# Altium schematic symbol library jlcpcb_2025_04_inductors_extended_0603.schlib: 1269 symbols (part 6 of 7)
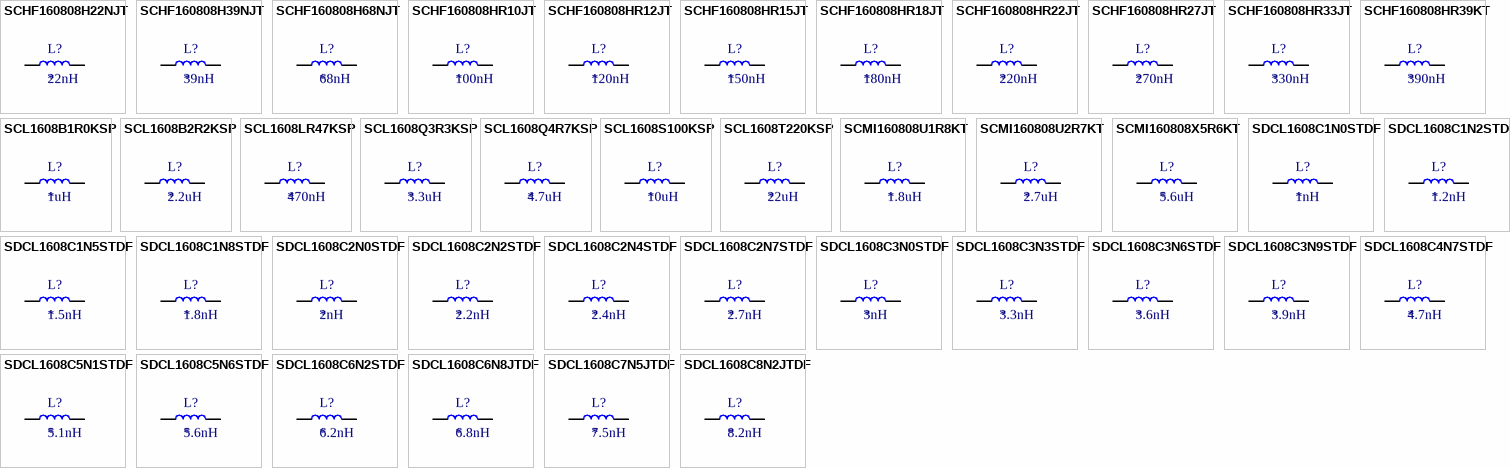
[diagram p36: symbols SCHF160808H22NJT to SDCL1608C8N2JTDF]

## SCL1608LR47KSP
designator L?  Inductance: 470nH
Inductor, 470nH, ±10%, 1.35Ω, 35mA, SMD 0603; Manufacturer: Sunltech Tech; Manufacturer Part Number: SCL1608LR47KSP; Package Size: 0603; JLCPCB Basic Part: No; JLCPCB Part Number: C411944; Supplier 1: LCSC; Category: Inductors; Supplier Part Number 1: C411944; Tolerance: ±10%; Rated Current: 35mA; DC Resistance: 1.35Ω; RoHS: Yes; ComponentLink1Description: Datasheet; ComponentLink1URL: https://wmsc.lcsc.com/wmsc/upload/file/pdf/v2/lcsc/2304140030_Sunltech-Tech-SCL1608LR47KSP_C411944.pdf; ComponentLink2Description: JLCPCB Part URL; ComponentLink2URL: https://jlcpcb.com/partdetail/C411944; ComponentLink3Description: LCSC Part URL; ComponentLink3URL: https://lcsc.com/product-detail/Inductors-SMD_Sunltech-Tech-Sunltech-Tech-SCL1608LR47KSP_C411944.html
footprint IND-0603 (0603 (1608M) Inductor)
pins: 1, 2

## SCL1608Q3R3KSP
designator L?  Inductance: 3.3uH
Inductor, 3.3uH, ±10%, 1.55Ω, 15mA, SMD 0603; Manufacturer: Sunltech Tech; Manufacturer Part Number: SCL1608Q3R3KSP; Package Size: 0603; JLCPCB Basic Part: No; JLCPCB Part Number: C411948; Supplier 1: LCSC; Category: Inductors; Supplier Part Number 1: C411948; Tolerance: ±10%; Rated Current: 15mA; DC Resistance: 1.55Ω; RoHS: Yes; ComponentLink1Description: Datasheet; ComponentLink1URL: https://wmsc.lcsc.com/wmsc/upload/file/pdf/v2/lcsc/2304140030_Sunltech-Tech-SCL1608Q3R3KSP_C411948.pdf; ComponentLink2Description: JLCPCB Part URL; ComponentLink2URL: https://jlcpcb.com/partdetail/C411948; ComponentLink3Description: LCSC Part URL; ComponentLink3URL: https://lcsc.com/product-detail/Inductors-SMD_Sunltech-Tech-Sunltech-Tech-SCL1608Q3R3KSP_C411948.html
footprint IND-0603 (0603 (1608M) Inductor)
pins: 1, 2

## SCL1608Q4R7KSP
designator L?  Inductance: 4.7uH
Inductor, 4.7uH, ±10%, 2.1Ω, 15mA, SMD 0603; Manufacturer: Sunltech Tech; Manufacturer Part Number: SCL1608Q4R7KSP; Package Size: 0603; JLCPCB Basic Part: No; JLCPCB Part Number: C411949; Supplier 1: LCSC; Category: Inductors; Supplier Part Number 1: C411949; Tolerance: ±10%; Rated Current: 15mA; DC Resistance: 2.1Ω; RoHS: Yes; ComponentLink1Description: Datasheet; ComponentLink1URL: https://wmsc.lcsc.com/wmsc/upload/file/pdf/v2/lcsc/2304140030_Sunltech-Tech-SCL1608Q4R7KSP_C411949.pdf; ComponentLink2Description: JLCPCB Part URL; ComponentLink2URL: https://jlcpcb.com/partdetail/C411949; ComponentLink3Description: LCSC Part URL; ComponentLink3URL: https://lcsc.com/product-detail/Inductors-SMD_Sunltech-Tech-Sunltech-Tech-SCL1608Q4R7KSP_C411949.html
footprint IND-0603 (0603 (1608M) Inductor)
pins: 1, 2

## SCL1608S100KSP
designator L?  Inductance: 10uH
Inductor, 10uH, ±10%, 1.85Ω, 3mA, SMD 0603; Manufacturer: Sunltech Tech; Manufacturer Part Number: SCL1608S100KSP; Package Size: 0603; JLCPCB Basic Part: No; JLCPCB Part Number: C411950; Supplier 1: LCSC; Category: Inductors; Supplier Part Number 1: C411950; Tolerance: ±10%; Rated Current: 3mA; DC Resistance: 1.85Ω; RoHS: Yes; ComponentLink1Description: Datasheet; ComponentLink1URL: https://wmsc.lcsc.com/wmsc/upload/file/pdf/v2/lcsc/2304140030_Sunltech-Tech-SCL1608S100KSP_C411950.pdf; ComponentLink2Description: JLCPCB Part URL; ComponentLink2URL: https://jlcpcb.com/partdetail/C411950; ComponentLink3Description: LCSC Part URL; ComponentLink3URL: https://lcsc.com/product-detail/Inductors-SMD_Sunltech-Tech-Sunltech-Tech-SCL1608S100KSP_C411950.html
footprint IND-0603 (0603 (1608M) Inductor)
pins: 1, 2

## SCL1608T220KSP
designator L?  Inductance: 22uH
Inductor, 22uH, ±10%, 2.1Ω, 1mA, SMD 0603; Manufacturer: Sunltech Tech; Manufacturer Part Number: SCL1608T220KSP; Package Size: 0603; JLCPCB Basic Part: No; JLCPCB Part Number: C411951; Supplier 1: LCSC; Category: Inductors; Supplier Part Number 1: C411951; Tolerance: ±10%; Rated Current: 1mA; DC Resistance: 2.1Ω; RoHS: Yes; ComponentLink1Description: Datasheet; ComponentLink1URL: https://wmsc.lcsc.com/wmsc/upload/file/pdf/v2/lcsc/2304140030_Sunltech-Tech-SCL1608T220KSP_C411951.pdf; ComponentLink2Description: JLCPCB Part URL; ComponentLink2URL: https://jlcpcb.com/partdetail/C411951; ComponentLink3Description: LCSC Part URL; ComponentLink3URL: https://lcsc.com/product-detail/Inductors-SMD_Sunltech-Tech-Sunltech-Tech-SCL1608T220KSP_C411951.html
footprint IND-0603 (0603 (1608M) Inductor)
pins: 1, 2

## SCMI160808U1R8KT
designator L?  Inductance: 1.8uH
Inductor, 1.8uH, ±10%, 750mΩ, 25mA, SMD 0603; Manufacturer: Yanchuang; Manufacturer Part Number: SCMI160808U1R8KT; Package Size: 0603; JLCPCB Basic Part: No; JLCPCB Part Number: C479883; Supplier 1: LCSC; Category: Inductors; Supplier Part Number 1: C479883; Tolerance: ±10%; Rated Current: 25mA; DC Resistance: 750mΩ; RoHS: Yes; ComponentLink1Description: Datasheet; ComponentLink1URL: https://wmsc.lcsc.com/wmsc/upload/file/pdf/v2/lcsc/2007222002_Yanchuang-SCMI160808U1R8KT_C479883.pdf; ComponentLink2Description: JLCPCB Part URL; ComponentLink2URL: https://jlcpcb.com/partdetail/C479883; ComponentLink3Description: LCSC Part URL; ComponentLink3URL: https://lcsc.com/product-detail/Inductors-SMD_Yanchuang-Yanchuang-SCMI160808U1R8KT_C479883.html
footprint IND-0603 (0603 (1608M) Inductor)
pins: 1, 2

## SCMI160808U2R7KT
designator L?  Inductance: 2.7uH
Inductor, 2.7uH, ±10%, 900mΩ, 15mA, SMD 0603; Manufacturer: Yanchuang; Manufacturer Part Number: SCMI160808U2R7KT; Package Size: 0603; JLCPCB Basic Part: No; JLCPCB Part Number: C479885; Supplier 1: LCSC; Category: Inductors; Supplier Part Number 1: C479885; Tolerance: ±10%; Rated Current: 15mA; DC Resistance: 900mΩ; RoHS: Yes; ComponentLink1Description: Datasheet; ComponentLink1URL: https://wmsc.lcsc.com/wmsc/upload/file/pdf/v2/lcsc/2007222002_Yanchuang-SCMI160808U2R7KT_C479885.pdf; ComponentLink2Description: JLCPCB Part URL; ComponentLink2URL: https://jlcpcb.com/partdetail/C479885; ComponentLink3Description: LCSC Part URL; ComponentLink3URL: https://lcsc.com/product-detail/Inductors-SMD_Yanchuang-Yanchuang-SCMI160808U2R7KT_C479885.html
footprint IND-0603 (0603 (1608M) Inductor)
pins: 1, 2

## SCMI160808X5R6KT
designator L?  Inductance: 5.6uH
Inductor, 5.6uH, ±10%, 1.55Ω, 5mA, SMD 0603; Manufacturer: Yanchuang; Manufacturer Part Number: SCMI160808X5R6KT; Self-Resonant Frequency: 22MHz; Q Factor: 12@4MHz; Package Size: 0603; JLCPCB Basic Part: No; JLCPCB Part Number: C479889; Supplier 1: LCSC; Category: Inductors; Supplier Part Number 1: C479889; Tolerance: ±10%; Rated Current: 5mA; DC Resistance: 1.55Ω; RoHS: Yes; ComponentLink1Description: Datasheet; ComponentLink1URL: https://wmsc.lcsc.com/wmsc/upload/file/pdf/v2/lcsc/2012021807_Yanchuang-SCMI160808X5R6KT_C479889.pdf; ComponentLink2Description: JLCPCB Part URL; ComponentLink2URL: https://jlcpcb.com/partdetail/C479889; ComponentLink3Description: LCSC Part URL; ComponentLink3URL: https://lcsc.com/product-detail/Inductors-SMD_Yanchuang-Yanchuang-SCMI160808X5R6KT_C479889.html
footprint IND-0603 (0603 (1608M) Inductor)
pins: 1, 2

## SDCL1608C1N0STDF
designator L?  Inductance: 1nH
Inductor, 1nH, 50mΩ, 500mA, SMD 0603; Manufacturer: Sunlord; Manufacturer Part Number: SDCL1608C1N0STDF; Self-Resonant Frequency: 100MHz; Q Factor: 8@100MHz; Package Size: 0603; JLCPCB Basic Part: No; JLCPCB Part Number: C41902; Supplier 1: LCSC; Category: Inductors; Supplier Part Number 1: C41902; Rated Current: 500mA; DC Resistance: 50mΩ; RoHS: Yes; ComponentLink1Description: Datasheet; ComponentLink1URL: https://wmsc.lcsc.com/wmsc/upload/file/pdf/v2/lcsc/2310301641_Sunlord-SDCL1608C1N0STDF_C41902.pdf; ComponentLink2Description: JLCPCB Part URL; ComponentLink2URL: https://jlcpcb.com/partdetail/C41902; ComponentLink3Description: LCSC Part URL; ComponentLink3URL: https://lcsc.com/product-detail/Inductors-SMD_Sunlord-Sunlord-SDCL1608C1N0STDF_C41902.html
footprint IND-0603 (0603 (1608M) Inductor)
pins: 1, 2

## SDCL1608C1N2STDF
designator L?  Inductance: 1.2nH
Inductor, 1.2nH, 50mΩ, 500mA, SMD 0603; Manufacturer: Sunlord; Manufacturer Part Number: SDCL1608C1N2STDF; Self-Resonant Frequency: 100MHz; Q Factor: 8@100MHz; Package Size: 0603; JLCPCB Basic Part: No; JLCPCB Part Number: C74311; Supplier 1: LCSC; Category: Inductors; Supplier Part Number 1: C74311; Rated Current: 500mA; DC Resistance: 50mΩ; RoHS: Yes; ComponentLink1Description: Datasheet; ComponentLink1URL: https://wmsc.lcsc.com/wmsc/upload/file/pdf/v2/lcsc/2310301641_Sunlord-SDCL1608C1N2STDF_C74311.pdf; ComponentLink2Description: JLCPCB Part URL; ComponentLink2URL: https://jlcpcb.com/partdetail/C74311; ComponentLink3Description: LCSC Part URL; ComponentLink3URL: https://lcsc.com/product-detail/Inductors-SMD_Sunlord-Sunlord-SDCL1608C1N2STDF_C74311.html
footprint IND-0603 (0603 (1608M) Inductor)
pins: 1, 2

## SDCL1608C1N5STDF
designator L?  Inductance: 1.5nH
Inductor, 1.5nH, 100mΩ, 500mA, SMD 0603; Manufacturer: Sunlord; Manufacturer Part Number: SDCL1608C1N5STDF; Self-Resonant Frequency: 100MHz; Q Factor: 8@100MHz; Package Size: 0603; JLCPCB Basic Part: No; JLCPCB Part Number: C22223; Supplier 1: LCSC; Category: Inductors; Supplier Part Number 1: C22223; Rated Current: 500mA; DC Resistance: 100mΩ; RoHS: Yes; ComponentLink1Description: Datasheet; ComponentLink1URL: https://wmsc.lcsc.com/wmsc/upload/file/pdf/v2/lcsc/2310301641_Sunlord-SDCL1608C1N5STDF_C22223.pdf; ComponentLink2Description: JLCPCB Part URL; ComponentLink2URL: https://jlcpcb.com/partdetail/C22223; ComponentLink3Description: LCSC Part URL; ComponentLink3URL: https://lcsc.com/product-detail/Inductors-SMD_Sunlord-Sunlord-SDCL1608C1N5STDF_C22223.html
footprint IND-0603 (0603 (1608M) Inductor)
pins: 1, 2

## SDCL1608C1N8STDF
designator L?  Inductance: 1.8nH
Inductor, 1.8nH, 100mΩ, 500mA, SMD 0603; Manufacturer: Sunlord; Manufacturer Part Number: SDCL1608C1N8STDF; Self-Resonant Frequency: 6GHz; Q Factor: 8@100MHz; Package Size: 0603; JLCPCB Basic Part: No; JLCPCB Part Number: C44946; Supplier 1: LCSC; Category: Inductors; Supplier Part Number 1: C44946; Rated Current: 500mA; DC Resistance: 100mΩ; RoHS: Yes; ComponentLink1Description: Datasheet; ComponentLink1URL: https://wmsc.lcsc.com/wmsc/upload/file/pdf/v2/lcsc/2310301641_Sunlord-SDCL1608C1N8STDF_C44946.pdf; ComponentLink2Description: JLCPCB Part URL; ComponentLink2URL: https://jlcpcb.com/partdetail/C44946; ComponentLink3Description: LCSC Part URL; ComponentLink3URL: https://lcsc.com/product-detail/Inductors-SMD_Sunlord-Sunlord-SDCL1608C1N8STDF_C44946.html
footprint IND-0603 (0603 (1608M) Inductor)
pins: 1, 2

## SDCL1608C2N0STDF
designator L?  Inductance: 2nH
Inductor, 2nH, SMD 0603; Manufacturer: Sunlord; Manufacturer Part Number: SDCL1608C2N0STDF; Package Size: 0603; JLCPCB Basic Part: No; JLCPCB Part Number: C370234; Supplier 1: LCSC; Category: Inductors; Supplier Part Number 1: C370234; RoHS: Yes; ComponentLink1Description: Datasheet; ComponentLink1URL: https://wmsc.lcsc.com/wmsc/upload/file/pdf/v2/lcsc/2310301641_Sunlord-SDCL1608C2N0STDF_C370234.pdf; ComponentLink2Description: JLCPCB Part URL; ComponentLink2URL: https://jlcpcb.com/partdetail/C370234; ComponentLink3Description: LCSC Part URL; ComponentLink3URL: https://lcsc.com/product-detail/Inductors-SMD_Sunlord-Sunlord-SDCL1608C2N0STDF_C370234.html
footprint IND-0603 (0603 (1608M) Inductor)
pins: 1, 2

## SDCL1608C2N2STDF
designator L?  Inductance: 2.2nH
Inductor, 2.2nH, 100mΩ, 500mA, SMD 0603; Manufacturer: Sunlord; Manufacturer Part Number: SDCL1608C2N2STDF; Self-Resonant Frequency: 100MHz; Q Factor: 8@100MHz; Package Size: 0603; JLCPCB Basic Part: No; JLCPCB Part Number: C29682; Supplier 1: LCSC; Category: Inductors; Supplier Part Number 1: C29682; Rated Current: 500mA; DC Resistance: 100mΩ; RoHS: Yes; ComponentLink1Description: Datasheet; ComponentLink1URL: https://wmsc.lcsc.com/wmsc/upload/file/pdf/v2/lcsc/2310301641_Sunlord-SDCL1608C2N2STDF_C29682.pdf; ComponentLink2Description: JLCPCB Part URL; ComponentLink2URL: https://jlcpcb.com/partdetail/C29682; ComponentLink3Description: LCSC Part URL; ComponentLink3URL: https://lcsc.com/product-detail/Inductors-SMD_Sunlord-Sunlord-SDCL1608C2N2STDF_C29682.html
footprint IND-0603 (0603 (1608M) Inductor)
pins: 1, 2

## SDCL1608C2N4STDF
designator L?  Inductance: 2.4nH
Inductor, 2.4nH, SMD 0603; Manufacturer: Sunlord; Manufacturer Part Number: SDCL1608C2N4STDF; Package Size: 0603; JLCPCB Basic Part: No; JLCPCB Part Number: C370235; Supplier 1: LCSC; Category: Inductors; Supplier Part Number 1: C370235; RoHS: Yes; ComponentLink1Description: Datasheet; ComponentLink1URL: https://wmsc.lcsc.com/wmsc/upload/file/pdf/v2/lcsc/2310301641_Sunlord-SDCL1608C2N4STDF_C370235.pdf; ComponentLink2Description: JLCPCB Part URL; ComponentLink2URL: https://jlcpcb.com/partdetail/C370235; ComponentLink3Description: LCSC Part URL; ComponentLink3URL: https://lcsc.com/product-detail/Inductors-SMD_Sunlord-Sunlord-SDCL1608C2N4STDF_C370235.html
footprint IND-0603 (0603 (1608M) Inductor)
pins: 1, 2

## SDCL1608C2N7STDF
designator L?  Inductance: 2.7nH
Inductor, 2.7nH, 120mΩ, 500mA, SMD 0603; Manufacturer: Sunlord; Manufacturer Part Number: SDCL1608C2N7STDF; Q Factor: 10@100MHz; Package Size: 0603; JLCPCB Basic Part: No; JLCPCB Part Number: C13817; Supplier 1: LCSC; Category: Inductors; Supplier Part Number 1: C13817; Rated Current: 500mA; DC Resistance: 120mΩ; RoHS: Yes; ComponentLink1Description: Datasheet; ComponentLink1URL: https://wmsc.lcsc.com/wmsc/upload/file/pdf/v2/lcsc/2310301641_Sunlord-SDCL1608C2N7STDF_C13817.pdf; ComponentLink2Description: JLCPCB Part URL; ComponentLink2URL: https://jlcpcb.com/partdetail/C13817; ComponentLink3Description: LCSC Part URL; ComponentLink3URL: https://lcsc.com/product-detail/Inductors-SMD_Sunlord-Sunlord-SDCL1608C2N7STDF_C13817.html
footprint IND-0603 (0603 (1608M) Inductor)
pins: 1, 2

## SDCL1608C3N0STDF
designator L?  Inductance: 3nH
Inductor, 3nH, 150mΩ, 500mA, SMD 0603; Manufacturer: Sunlord; Manufacturer Part Number: SDCL1608C3N0STDF; Package Size: 0603; JLCPCB Basic Part: No; JLCPCB Part Number: C22724; Supplier 1: LCSC; Category: Inductors; Supplier Part Number 1: C22724; Rated Current: 500mA; DC Resistance: 150mΩ; RoHS: Yes; ComponentLink1Description: Datasheet; ComponentLink1URL: https://wmsc.lcsc.com/wmsc/upload/file/pdf/v2/lcsc/2310301641_Sunlord-SDCL1608C3N0STDF_C22724.pdf; ComponentLink2Description: JLCPCB Part URL; ComponentLink2URL: https://jlcpcb.com/partdetail/C22724; ComponentLink3Description: LCSC Part URL; ComponentLink3URL: https://lcsc.com/product-detail/Inductors-SMD_Sunlord-Sunlord-SDCL1608C3N0STDF_C22724.html
footprint IND-0603 (0603 (1608M) Inductor)
pins: 1, 2

## SDCL1608C3N3STDF
designator L?  Inductance: 3.3nH
Inductor, 3.3nH, 150mΩ, 500mA, SMD 0603; Manufacturer: Sunlord; Manufacturer Part Number: SDCL1608C3N3STDF; Self-Resonant Frequency: 100MHz; Q Factor: 10@100MHz; Package Size: 0603; JLCPCB Basic Part: No; JLCPCB Part Number: C27274; Supplier 1: LCSC; Category: Inductors; Supplier Part Number 1: C27274; Rated Current: 500mA; DC Resistance: 150mΩ; RoHS: Yes; ComponentLink1Description: Datasheet; ComponentLink1URL: https://wmsc.lcsc.com/wmsc/upload/file/pdf/v2/lcsc/2310301641_Sunlord-SDCL1608C3N3STDF_C27274.pdf; ComponentLink2Description: JLCPCB Part URL; ComponentLink2URL: https://jlcpcb.com/partdetail/C27274; ComponentLink3Description: LCSC Part URL; ComponentLink3URL: https://lcsc.com/product-detail/Inductors-SMD_Sunlord-Sunlord-SDCL1608C3N3STDF_C27274.html
footprint IND-0603 (0603 (1608M) Inductor)
pins: 1, 2

## SDCL1608C3N6STDF
designator L?  Inductance: 3.6nH
Inductor, 3.6nH, SMD 0603; Manufacturer: Sunlord; Manufacturer Part Number: SDCL1608C3N6STDF; Package Size: 0603; JLCPCB Basic Part: No; JLCPCB Part Number: C370237; Supplier 1: LCSC; Category: Inductors; Supplier Part Number 1: C370237; RoHS: Yes; ComponentLink1Description: Datasheet; ComponentLink1URL: https://wmsc.lcsc.com/wmsc/upload/file/pdf/v2/lcsc/2310301641_Sunlord-SDCL1608C3N6STDF_C370237.pdf; ComponentLink2Description: JLCPCB Part URL; ComponentLink2URL: https://jlcpcb.com/partdetail/C370237; ComponentLink3Description: LCSC Part URL; ComponentLink3URL: https://lcsc.com/product-detail/Inductors-SMD_Sunlord-Sunlord-SDCL1608C3N6STDF_C370237.html
footprint IND-0603 (0603 (1608M) Inductor)
pins: 1, 2

## SDCL1608C3N9STDF
designator L?  Inductance: 3.9nH
Inductor, 3.9nH, 160mΩ, 500mA, SMD 0603; Manufacturer: Sunlord; Manufacturer Part Number: SDCL1608C3N9STDF; Self-Resonant Frequency: 100MHz; Q Factor: 10@100MHz; Package Size: 0603; JLCPCB Basic Part: No; JLCPCB Part Number: C13818; Supplier 1: LCSC; Category: Inductors; Supplier Part Number 1: C13818; Rated Current: 500mA; DC Resistance: 160mΩ; RoHS: Yes; ComponentLink1Description: Datasheet; ComponentLink1URL: https://wmsc.lcsc.com/wmsc/upload/file/pdf/v2/lcsc/2310301641_Sunlord-SDCL1608C3N9STDF_C13818.pdf; ComponentLink2Description: JLCPCB Part URL; ComponentLink2URL: https://jlcpcb.com/partdetail/C13818; ComponentLink3Description: LCSC Part URL; ComponentLink3URL: https://lcsc.com/product-detail/Inductors-SMD_Sunlord-Sunlord-SDCL1608C3N9STDF_C13818.html
footprint IND-0603 (0603 (1608M) Inductor)
pins: 1, 2

## SDCL1608C4N7STDF
designator L?  Inductance: 4.7nH
Inductor, 4.7nH, 200mΩ, 500mA, SMD 0603; Manufacturer: Sunlord; Manufacturer Part Number: SDCL1608C4N7STDF; Self-Resonant Frequency: 100MHz; Q Factor: 10@100MHz; Package Size: 0603; JLCPCB Basic Part: No; JLCPCB Part Number: C89955; Supplier 1: LCSC; Category: Inductors; Supplier Part Number 1: C89955; Rated Current: 500mA; DC Resistance: 200mΩ; RoHS: Yes; ComponentLink1Description: Datasheet; ComponentLink1URL: https://wmsc.lcsc.com/wmsc/upload/file/pdf/v2/lcsc/2310301641_Sunlord-SDCL1608C4N7STDF_C89955.pdf; ComponentLink2Description: JLCPCB Part URL; ComponentLink2URL: https://jlcpcb.com/partdetail/C89955; ComponentLink3Description: LCSC Part URL; ComponentLink3URL: https://lcsc.com/product-detail/Inductors-SMD_Sunlord-Sunlord-SDCL1608C4N7STDF_C89955.html
footprint IND-0603 (0603 (1608M) Inductor)
pins: 1, 2

## SDCL1608C5N1STDF
designator L?  Inductance: 5.1nH
Inductor, 5.1nH, SMD 0603; Manufacturer: Sunlord; Manufacturer Part Number: SDCL1608C5N1STDF; Package Size: 0603; JLCPCB Basic Part: No; JLCPCB Part Number: C370239; Supplier 1: LCSC; Category: Inductors; Supplier Part Number 1: C370239; RoHS: Yes; ComponentLink1Description: Datasheet; ComponentLink1URL: https://wmsc.lcsc.com/wmsc/upload/file/pdf/v2/lcsc/2310301641_Sunlord-SDCL1608C5N1STDF_C370239.pdf; ComponentLink2Description: JLCPCB Part URL; ComponentLink2URL: https://jlcpcb.com/partdetail/C370239; ComponentLink3Description: LCSC Part URL; ComponentLink3URL: https://lcsc.com/product-detail/Inductors-SMD_Sunlord-Sunlord-SDCL1608C5N1STDF_C370239.html
footprint IND-0603 (0603 (1608M) Inductor)
pins: 1, 2

## SDCL1608C5N6STDF
designator L?  Inductance: 5.6nH
Inductor, 5.6nH, 250mΩ, 500mA, SMD 0603; Manufacturer: Sunlord; Manufacturer Part Number: SDCL1608C5N6STDF; Self-Resonant Frequency: 100MHz; Q Factor: 10@100MHz; Package Size: 0603; JLCPCB Basic Part: No; JLCPCB Part Number: C74312; Supplier 1: LCSC; Category: Inductors; Supplier Part Number 1: C74312; Rated Current: 500mA; DC Resistance: 250mΩ; RoHS: Yes; ComponentLink1Description: Datasheet; ComponentLink1URL: https://wmsc.lcsc.com/wmsc/upload/file/pdf/v2/lcsc/2310301641_Sunlord-SDCL1608C5N6STDF_C74312.pdf; ComponentLink2Description: JLCPCB Part URL; ComponentLink2URL: https://jlcpcb.com/partdetail/C74312; ComponentLink3Description: LCSC Part URL; ComponentLink3URL: https://lcsc.com/product-detail/Inductors-SMD_Sunlord-Sunlord-SDCL1608C5N6STDF_C74312.html
footprint IND-0603 (0603 (1608M) Inductor)
pins: 1, 2

## SDCL1608C6N2STDF
designator L?  Inductance: 6.2nH
Inductor, 6.2nH, SMD 0603; Manufacturer: Sunlord; Manufacturer Part Number: SDCL1608C6N2STDF; Package Size: 0603; JLCPCB Basic Part: No; JLCPCB Part Number: C370240; Supplier 1: LCSC; Category: Inductors; Supplier Part Number 1: C370240; RoHS: Yes; ComponentLink1Description: Datasheet; ComponentLink1URL: https://wmsc.lcsc.com/wmsc/upload/file/pdf/v2/lcsc/2310301641_Sunlord-SDCL1608C6N2STDF_C370240.pdf; ComponentLink2Description: JLCPCB Part URL; ComponentLink2URL: https://jlcpcb.com/partdetail/C370240; ComponentLink3Description: LCSC Part URL; ComponentLink3URL: https://lcsc.com/product-detail/Inductors-SMD_Sunlord-Sunlord-SDCL1608C6N2STDF_C370240.html
footprint IND-0603 (0603 (1608M) Inductor)
pins: 1, 2

## SDCL1608C6N8JTDF
designator L?  Inductance: 6.8nH
Inductor, 6.8nH, ±5%, 300mΩ, 500mA, SMD 0603; Manufacturer: Sunlord; Manufacturer Part Number: SDCL1608C6N8JTDF; Self-Resonant Frequency: 100MHz; Q Factor: 10@100MHz; Package Size: 0603; JLCPCB Basic Part: No; JLCPCB Part Number: C49447; Supplier 1: LCSC; Category: Inductors; Supplier Part Number 1: C49447; Tolerance: ±5%; Rated Current: 500mA; DC Resistance: 300mΩ; RoHS: Yes; ComponentLink1Description: Datasheet; ComponentLink1URL: https://wmsc.lcsc.com/wmsc/upload/file/pdf/v2/lcsc/2310301641_Sunlord-SDCL1608C6N8JTDF_C49447.pdf; ComponentLink2Description: JLCPCB Part URL; ComponentLink2URL: https://jlcpcb.com/partdetail/C49447; ComponentLink3Description: LCSC Part URL; ComponentLink3URL: https://lcsc.com/product-detail/Inductors-SMD_Sunlord-Sunlord-SDCL1608C6N8JTDF_C49447.html
footprint IND-0603 (0603 (1608M) Inductor)
pins: 1, 2

## SDCL1608C7N5JTDF
designator L?  Inductance: 7.5nH
Inductor, 7.5nH, ±5%, SMD 0603; Manufacturer: Sunlord; Manufacturer Part Number: SDCL1608C7N5JTDF; Package Size: 0603; JLCPCB Basic Part: No; JLCPCB Part Number: C74304; Supplier 1: LCSC; Category: Inductors; Supplier Part Number 1: C74304; Tolerance: ±5%; RoHS: Yes; ComponentLink1Description: Datasheet; ComponentLink1URL: https://wmsc.lcsc.com/wmsc/upload/file/pdf/v2/lcsc/2310301641_Sunlord-SDCL1608C7N5JTDF_C74304.pdf; ComponentLink2Description: JLCPCB Part URL; ComponentLink2URL: https://jlcpcb.com/partdetail/C74304; ComponentLink3Description: LCSC Part URL; ComponentLink3URL: https://lcsc.com/product-detail/Inductors-SMD_Sunlord-Sunlord-SDCL1608C7N5JTDF_C74304.html
footprint IND-0603 (0603 (1608M) Inductor)
pins: 1, 2

## SDCL1608C8N2JTDF
designator L?  Inductance: 8.2nH
Inductor, 8.2nH, ±5%, 350mΩ, 500mA, SMD 0603; Manufacturer: Sunlord; Manufacturer Part Number: SDCL1608C8N2JTDF; Self-Resonant Frequency: 100MHz; Q Factor: 10@100MHz; Package Size: 0603; JLCPCB Basic Part: No; JLCPCB Part Number: C1032; Supplier 1: LCSC; Category: Inductors; Supplier Part Number 1: C1032; Tolerance: ±5%; Rated Current: 500mA; DC Resistance: 350mΩ; RoHS: Yes; ComponentLink1Description: Datasheet; ComponentLink1URL: https://wmsc.lcsc.com/wmsc/upload/file/pdf/v2/lcsc/2310301641_Sunlord-SDCL1608C8N2JTDF_C1032.pdf; ComponentLink2Description: JLCPCB Part URL; ComponentLink2URL: https://jlcpcb.com/partdetail/C1032; ComponentLink3Description: LCSC Part URL; ComponentLink3URL: https://lcsc.com/product-detail/Inductors-SMD_Sunlord-Sunlord-SDCL1608C8N2JTDF_C1032.html
footprint IND-0603 (0603 (1608M) Inductor)
pins: 1, 2

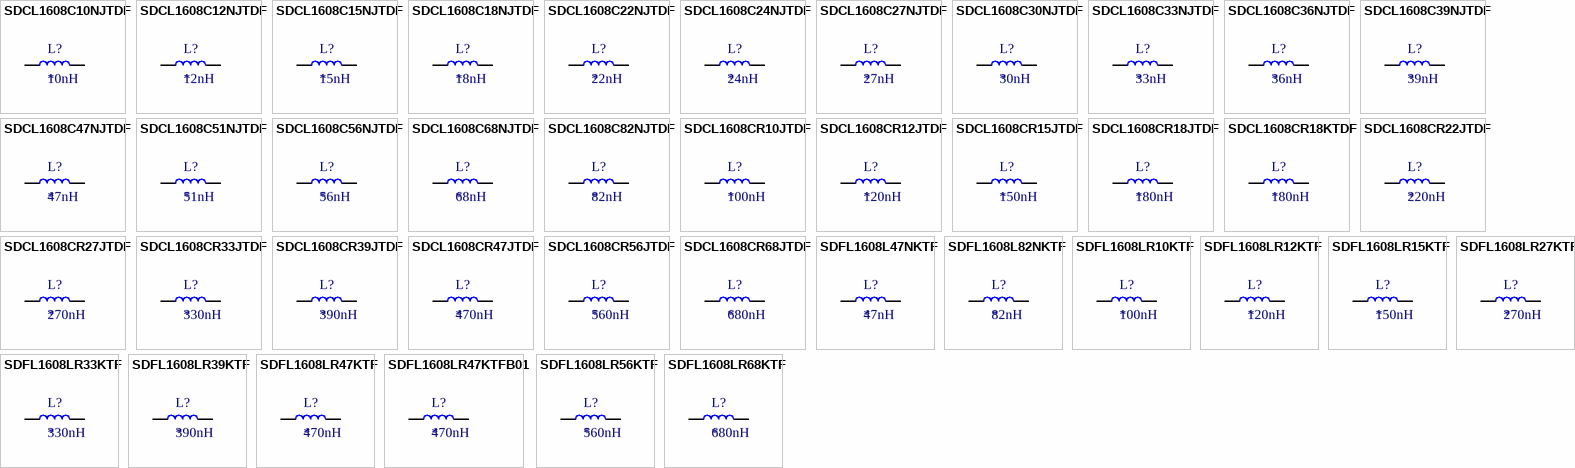
[diagram p25: symbols SDCL1608C10NJTDF to SDFL1608LR68KTF]

## SDCL1608C10NJTDF
designator L?  Inductance: 10nH
Inductor, 10nH, ±5%, 400mΩ, 300mA, SMD 0603; Manufacturer: Sunlord; Manufacturer Part Number: SDCL1608C10NJTDF; Self-Resonant Frequency: 100MHz; Q Factor: 12@100MHz; Package Size: 0603; JLCPCB Basic Part: No; JLCPCB Part Number: C15666; Supplier 1: LCSC; Category: Inductors; Supplier Part Number 1: C15666; Tolerance: ±5%; Rated Current: 300mA; DC Resistance: 400mΩ; RoHS: Yes; ComponentLink1Description: Datasheet; ComponentLink1URL: https://wmsc.lcsc.com/wmsc/upload/file/pdf/v2/lcsc/2310301641_Sunlord-SDCL1608C10NJTDF_C15666.pdf; ComponentLink2Description: JLCPCB Part URL; ComponentLink2URL: https://jlcpcb.com/partdetail/C15666; ComponentLink3Description: LCSC Part URL; ComponentLink3URL: https://lcsc.com/product-detail/Inductors-SMD_Sunlord-Sunlord-SDCL1608C10NJTDF_C15666.html
footprint IND-0603 (0603 (1608M) Inductor)
pins: 1, 2

## SDCL1608C12NJTDF
designator L?  Inductance: 12nH
Inductor, 12nH, ±5%, 450mΩ, 300mA, SMD 0603; Manufacturer: Sunlord; Manufacturer Part Number: SDCL1608C12NJTDF; Self-Resonant Frequency: 100MHz; Q Factor: 12@100MHz; Package Size: 0603; JLCPCB Basic Part: No; JLCPCB Part Number: C29258; Supplier 1: LCSC; Category: Inductors; Supplier Part Number 1: C29258; Tolerance: ±5%; Rated Current: 300mA; DC Resistance: 450mΩ; RoHS: Yes; ComponentLink1Description: Datasheet; ComponentLink1URL: https://wmsc.lcsc.com/wmsc/upload/file/pdf/v2/lcsc/2310301641_Sunlord-SDCL1608C12NJTDF_C29258.pdf; ComponentLink2Description: JLCPCB Part URL; ComponentLink2URL: https://jlcpcb.com/partdetail/C29258; ComponentLink3Description: LCSC Part URL; ComponentLink3URL: https://lcsc.com/product-detail/Inductors-SMD_Sunlord-Sunlord-SDCL1608C12NJTDF_C29258.html
footprint IND-0603 (0603 (1608M) Inductor)
pins: 1, 2

## SDCL1608C15NJTDF
designator L?  Inductance: 15nH
Inductor, 15nH, ±5%, 500mΩ, 300mA, SMD 0603; Manufacturer: Sunlord; Manufacturer Part Number: SDCL1608C15NJTDF; Self-Resonant Frequency: 100MHz; Q Factor: 12@100MHz; Package Size: 0603; JLCPCB Basic Part: No; JLCPCB Part Number: C23651; Supplier 1: LCSC; Category: Inductors; Supplier Part Number 1: C23651; Tolerance: ±5%; Rated Current: 300mA; DC Resistance: 500mΩ; RoHS: Yes; ComponentLink1Description: Datasheet; ComponentLink1URL: https://wmsc.lcsc.com/wmsc/upload/file/pdf/v2/lcsc/2310301641_Sunlord-SDCL1608C15NJTDF_C23651.pdf; ComponentLink2Description: JLCPCB Part URL; ComponentLink2URL: https://jlcpcb.com/partdetail/C23651; ComponentLink3Description: LCSC Part URL; ComponentLink3URL: https://lcsc.com/product-detail/Inductors-SMD_Sunlord-Sunlord-SDCL1608C15NJTDF_C23651.html
footprint IND-0603 (0603 (1608M) Inductor)
pins: 1, 2

## SDCL1608C18NJTDF
designator L?  Inductance: 18nH
Inductor, 18nH, ±5%, 550mΩ, 300mA, SMD 0603; Manufacturer: Sunlord; Manufacturer Part Number: SDCL1608C18NJTDF; Self-Resonant Frequency: 100MHz; Q Factor: 12@100MHz; Package Size: 0603; JLCPCB Basic Part: No; JLCPCB Part Number: C48590; Supplier 1: LCSC; Category: Inductors; Supplier Part Number 1: C48590; Tolerance: ±5%; Rated Current: 300mA; DC Resistance: 550mΩ; RoHS: Yes; ComponentLink1Description: Datasheet; ComponentLink1URL: https://wmsc.lcsc.com/wmsc/upload/file/pdf/v2/lcsc/2310301641_Sunlord-SDCL1608C18NJTDF_C48590.pdf; ComponentLink2Description: JLCPCB Part URL; ComponentLink2URL: https://jlcpcb.com/partdetail/C48590; ComponentLink3Description: LCSC Part URL; ComponentLink3URL: https://lcsc.com/product-detail/Inductors-SMD_Sunlord-Sunlord-SDCL1608C18NJTDF_C48590.html
footprint IND-0603 (0603 (1608M) Inductor)
pins: 1, 2

## SDCL1608C22NJTDF
designator L?  Inductance: 22nH
Inductor, 22nH, ±5%, 600mΩ, 300mA, SMD 0603; Manufacturer: Sunlord; Manufacturer Part Number: SDCL1608C22NJTDF; Q Factor: 12@100MHz; Package Size: 0603; JLCPCB Basic Part: No; JLCPCB Part Number: C12099; Supplier 1: LCSC; Category: Inductors; Supplier Part Number 1: C12099; Tolerance: ±5%; Rated Current: 300mA; DC Resistance: 600mΩ; RoHS: Yes; ComponentLink1Description: Datasheet; ComponentLink1URL: https://wmsc.lcsc.com/wmsc/upload/file/pdf/v2/lcsc/2310301641_Sunlord-SDCL1608C22NJTDF_C12099.pdf; ComponentLink2Description: JLCPCB Part URL; ComponentLink2URL: https://jlcpcb.com/partdetail/C12099; ComponentLink3Description: LCSC Part URL; ComponentLink3URL: https://lcsc.com/product-detail/Inductors-SMD_Sunlord-Sunlord-SDCL1608C22NJTDF_C12099.html
footprint IND-0603 (0603 (1608M) Inductor)
pins: 1, 2

## SDCL1608C24NJTDF
designator L?  Inductance: 24nH
Inductor, 24nH, ±5%, 100mΩ, 500mA, SMD 0603; Manufacturer: Sunlord; Manufacturer Part Number: SDCL1608C24NJTDF; Package Size: 0603; JLCPCB Basic Part: No; JLCPCB Part Number: C74305; Supplier 1: LCSC; Category: Inductors; Supplier Part Number 1: C74305; Tolerance: ±5%; Rated Current: 500mA; DC Resistance: 100mΩ; RoHS: Yes; ComponentLink1Description: Datasheet; ComponentLink1URL: https://wmsc.lcsc.com/wmsc/upload/file/pdf/v2/lcsc/2310301641_Sunlord-SDCL1608C24NJTDF_C74305.pdf; ComponentLink2Description: JLCPCB Part URL; ComponentLink2URL: https://jlcpcb.com/partdetail/C74305; ComponentLink3Description: LCSC Part URL; ComponentLink3URL: https://lcsc.com/product-detail/Inductors-SMD_Sunlord-Sunlord-SDCL1608C24NJTDF_C74305.html
footprint IND-0603 (0603 (1608M) Inductor)
pins: 1, 2

## SDCL1608C27NJTDF
designator L?  Inductance: 27nH
Inductor, 27nH, ±5%, 650mΩ, 300mA, SMD 0603; Manufacturer: Sunlord; Manufacturer Part Number: SDCL1608C27NJTDF; Self-Resonant Frequency: 100MHz; Q Factor: 12@100MHz; Package Size: 0603; JLCPCB Basic Part: No; JLCPCB Part Number: C12100; Supplier 1: LCSC; Category: Inductors; Supplier Part Number 1: C12100; Tolerance: ±5%; Rated Current: 300mA; DC Resistance: 650mΩ; RoHS: Yes; ComponentLink1Description: Datasheet; ComponentLink1URL: https://wmsc.lcsc.com/wmsc/upload/file/pdf/v2/lcsc/2310301641_Sunlord-SDCL1608C27NJTDF_C12100.pdf; ComponentLink2Description: JLCPCB Part URL; ComponentLink2URL: https://jlcpcb.com/partdetail/C12100; ComponentLink3Description: LCSC Part URL; ComponentLink3URL: https://lcsc.com/product-detail/Inductors-SMD_Sunlord-Sunlord-SDCL1608C27NJTDF_C12100.html
footprint IND-0603 (0603 (1608M) Inductor)
pins: 1, 2

## SDCL1608C30NJTDF
designator L?  Inductance: 30nH
Inductor, 30nH, ±5%, SMD 0603; Manufacturer: Sunlord; Manufacturer Part Number: SDCL1608C30NJTDF; Package Size: 0603; JLCPCB Basic Part: No; JLCPCB Part Number: C370236; Supplier 1: LCSC; Category: Inductors; Supplier Part Number 1: C370236; Tolerance: ±5%; RoHS: Yes; ComponentLink1Description: Datasheet; ComponentLink1URL: https://wmsc.lcsc.com/wmsc/upload/file/pdf/v2/lcsc/2310301641_Sunlord-SDCL1608C30NJTDF_C370236.pdf; ComponentLink2Description: JLCPCB Part URL; ComponentLink2URL: https://jlcpcb.com/partdetail/C370236; ComponentLink3Description: LCSC Part URL; ComponentLink3URL: https://lcsc.com/product-detail/Inductors-SMD_Sunlord-Sunlord-SDCL1608C30NJTDF_C370236.html
footprint IND-0603 (0603 (1608M) Inductor)
pins: 1, 2

## SDCL1608C33NJTDF
designator L?  Inductance: 33nH
Inductor, 33nH, ±5%, 700mΩ, 300mA, SMD 0603; Manufacturer: Sunlord; Manufacturer Part Number: SDCL1608C33NJTDF; Self-Resonant Frequency: 100MHz; Q Factor: 12@100MHz; Package Size: 0603; JLCPCB Basic Part: No; JLCPCB Part Number: C35050; Supplier 1: LCSC; Category: Inductors; Supplier Part Number 1: C35050; Tolerance: ±5%; Rated Current: 300mA; DC Resistance: 700mΩ; RoHS: Yes; ComponentLink1Description: Datasheet; ComponentLink1URL: https://wmsc.lcsc.com/wmsc/upload/file/pdf/v2/lcsc/2310301641_Sunlord-SDCL1608C33NJTDF_C35050.pdf; ComponentLink2Description: JLCPCB Part URL; ComponentLink2URL: https://jlcpcb.com/partdetail/C35050; ComponentLink3Description: LCSC Part URL; ComponentLink3URL: https://lcsc.com/product-detail/Inductors-SMD_Sunlord-Sunlord-SDCL1608C33NJTDF_C35050.html
footprint IND-0603 (0603 (1608M) Inductor)
pins: 1, 2

## SDCL1608C36NJTDF
designator L?  Inductance: 36nH
Inductor, 36nH, ±5%, SMD 0603; Manufacturer: Sunlord; Manufacturer Part Number: SDCL1608C36NJTDF; Package Size: 0603; JLCPCB Basic Part: No; JLCPCB Part Number: C316413; Supplier 1: LCSC; Category: Inductors; Supplier Part Number 1: C316413; Tolerance: ±5%; RoHS: Yes; ComponentLink1Description: Datasheet; ComponentLink1URL: https://wmsc.lcsc.com/wmsc/upload/file/pdf/v2/lcsc/2310301641_Sunlord-SDCL1608C36NJTDF_C316413.pdf; ComponentLink2Description: JLCPCB Part URL; ComponentLink2URL: https://jlcpcb.com/partdetail/C316413; ComponentLink3Description: LCSC Part URL; ComponentLink3URL: https://lcsc.com/product-detail/Inductors-SMD_Sunlord-Sunlord-SDCL1608C36NJTDF_C316413.html
footprint IND-0603 (0603 (1608M) Inductor)
pins: 1, 2

## SDCL1608C39NJTDF
designator L?  Inductance: 39nH
Inductor, 39nH, ±5%, 700mΩ, 300mA, SMD 0603; Manufacturer: Sunlord; Manufacturer Part Number: SDCL1608C39NJTDF; Q Factor: 12@100MHz; Package Size: 0603; JLCPCB Basic Part: No; JLCPCB Part Number: C74308; Supplier 1: LCSC; Category: Inductors; Supplier Part Number 1: C74308; Tolerance: ±5%; Rated Current: 300mA; DC Resistance: 700mΩ; RoHS: Yes; ComponentLink1Description: Datasheet; ComponentLink1URL: https://wmsc.lcsc.com/wmsc/upload/file/pdf/v2/lcsc/2310301641_Sunlord-SDCL1608C39NJTDF_C74308.pdf; ComponentLink2Description: JLCPCB Part URL; ComponentLink2URL: https://jlcpcb.com/partdetail/C74308; ComponentLink3Description: LCSC Part URL; ComponentLink3URL: https://lcsc.com/product-detail/Inductors-SMD_Sunlord-Sunlord-SDCL1608C39NJTDF_C74308.html
footprint IND-0603 (0603 (1608M) Inductor)
pins: 1, 2

## SDCL1608C47NJTDF
designator L?  Inductance: 47nH
Inductor, 47nH, ±5%, 700mΩ, 300mA, SMD 0603; Manufacturer: Sunlord; Manufacturer Part Number: SDCL1608C47NJTDF; Self-Resonant Frequency: 100MHz; Q Factor: 12@100MHz; Package Size: 0603; JLCPCB Basic Part: No; JLCPCB Part Number: C29683; Supplier 1: LCSC; Category: Inductors; Supplier Part Number 1: C29683; Tolerance: ±5%; Rated Current: 300mA; DC Resistance: 700mΩ; RoHS: Yes; ComponentLink1Description: Datasheet; ComponentLink1URL: https://wmsc.lcsc.com/wmsc/upload/file/pdf/v2/lcsc/2310301641_Sunlord-SDCL1608C47NJTDF_C29683.pdf; ComponentLink2Description: JLCPCB Part URL; ComponentLink2URL: https://jlcpcb.com/partdetail/C29683; ComponentLink3Description: LCSC Part URL; ComponentLink3URL: https://lcsc.com/product-detail/Inductors-SMD_Sunlord-Sunlord-SDCL1608C47NJTDF_C29683.html
footprint IND-0603 (0603 (1608M) Inductor)
pins: 1, 2

## SDCL1608C51NJTDF
designator L?  Inductance: 51nH
Inductor, 51nH, ±5%, SMD 0603; Manufacturer: Sunlord; Manufacturer Part Number: SDCL1608C51NJTDF; Package Size: 0603; JLCPCB Basic Part: No; JLCPCB Part Number: C370238; Supplier 1: LCSC; Category: Inductors; Supplier Part Number 1: C370238; Tolerance: ±5%; RoHS: Yes; ComponentLink1Description: Datasheet; ComponentLink1URL: https://wmsc.lcsc.com/wmsc/upload/file/pdf/v2/lcsc/2310301641_Sunlord-SDCL1608C51NJTDF_C370238.pdf; ComponentLink2Description: JLCPCB Part URL; ComponentLink2URL: https://jlcpcb.com/partdetail/C370238; ComponentLink3Description: LCSC Part URL; ComponentLink3URL: https://lcsc.com/product-detail/Inductors-SMD_Sunlord-Sunlord-SDCL1608C51NJTDF_C370238.html
footprint IND-0603 (0603 (1608M) Inductor)
pins: 1, 2

## SDCL1608C56NJTDF
designator L?  Inductance: 56nH
Inductor, 56nH, ±5%, 750mΩ, 300mA, SMD 0603; Manufacturer: Sunlord; Manufacturer Part Number: SDCL1608C56NJTDF; Q Factor: 12@100MHz; Package Size: 0603; JLCPCB Basic Part: No; JLCPCB Part Number: C12831; Supplier 1: LCSC; Category: Inductors; Supplier Part Number 1: C12831; Tolerance: ±5%; Rated Current: 300mA; DC Resistance: 750mΩ; RoHS: Yes; ComponentLink1Description: Datasheet; ComponentLink1URL: https://wmsc.lcsc.com/wmsc/upload/file/pdf/v2/lcsc/2310301641_Sunlord-SDCL1608C56NJTDF_C12831.pdf; ComponentLink2Description: JLCPCB Part URL; ComponentLink2URL: https://jlcpcb.com/partdetail/C12831; ComponentLink3Description: LCSC Part URL; ComponentLink3URL: https://lcsc.com/product-detail/Inductors-SMD_Sunlord-Sunlord-SDCL1608C56NJTDF_C12831.html
footprint IND-0603 (0603 (1608M) Inductor)
pins: 1, 2

## SDCL1608C68NJTDF
designator L?  Inductance: 68nH
Inductor, 68nH, ±5%, 850mΩ, 300mA, SMD 0603; Manufacturer: Sunlord; Manufacturer Part Number: SDCL1608C68NJTDF; Self-Resonant Frequency: 100MHz; Q Factor: 12@100MHz; Package Size: 0603; JLCPCB Basic Part: No; JLCPCB Part Number: C13415; Supplier 1: LCSC; Category: Inductors; Supplier Part Number 1: C13415; Tolerance: ±5%; Rated Current: 300mA; DC Resistance: 850mΩ; RoHS: Yes; ComponentLink1Description: Datasheet; ComponentLink1URL: https://wmsc.lcsc.com/wmsc/upload/file/pdf/v2/lcsc/2310301641_Sunlord-SDCL1608C68NJTDF_C13415.pdf; ComponentLink2Description: JLCPCB Part URL; ComponentLink2URL: https://jlcpcb.com/partdetail/C13415; ComponentLink3Description: LCSC Part URL; ComponentLink3URL: https://lcsc.com/product-detail/Inductors-SMD_Sunlord-Sunlord-SDCL1608C68NJTDF_C13415.html
footprint IND-0603 (0603 (1608M) Inductor)
pins: 1, 2

## SDCL1608C82NJTDF
designator L?  Inductance: 82nH
Inductor, 82nH, ±5%, 1Ω, 300mA, SMD 0603; Manufacturer: Sunlord; Manufacturer Part Number: SDCL1608C82NJTDF; Q Factor: 8@100MHz; Package Size: 0603; JLCPCB Basic Part: No; JLCPCB Part Number: C23473; Supplier 1: LCSC; Category: Inductors; Supplier Part Number 1: C23473; Tolerance: ±5%; Rated Current: 300mA; DC Resistance: 1Ω; RoHS: Yes; ComponentLink1Description: Datasheet; ComponentLink1URL: https://wmsc.lcsc.com/wmsc/upload/file/pdf/v2/lcsc/2310301641_Sunlord-SDCL1608C82NJTDF_C23473.pdf; ComponentLink2Description: JLCPCB Part URL; ComponentLink2URL: https://jlcpcb.com/partdetail/C23473; ComponentLink3Description: LCSC Part URL; ComponentLink3URL: https://lcsc.com/product-detail/Inductors-SMD_Sunlord-Sunlord-SDCL1608C82NJTDF_C23473.html
footprint IND-0603 (0603 (1608M) Inductor)
pins: 1, 2

## SDCL1608CR10JTDF
designator L?  Inductance: 100nH
Inductor, 100nH, ±5%, 1.2Ω, 300mA, SMD 0603; Manufacturer: Sunlord; Manufacturer Part Number: SDCL1608CR10JTDF; Self-Resonant Frequency: 100MHz; Q Factor: 8@100MHz; Package Size: 0603; JLCPCB Basic Part: No; JLCPCB Part Number: C74310; Supplier 1: LCSC; Category: Inductors; Supplier Part Number 1: C74310; Tolerance: ±5%; Rated Current: 300mA; DC Resistance: 1.2Ω; RoHS: Yes; ComponentLink1Description: Datasheet; ComponentLink1URL: https://wmsc.lcsc.com/wmsc/upload/file/pdf/v2/lcsc/2310301641_Sunlord-SDCL1608CR10JTDF_C74310.pdf; ComponentLink2Description: JLCPCB Part URL; ComponentLink2URL: https://jlcpcb.com/partdetail/C74310; ComponentLink3Description: LCSC Part URL; ComponentLink3URL: https://lcsc.com/product-detail/Inductors-SMD_Sunlord-Sunlord-SDCL1608CR10JTDF_C74310.html
footprint IND-0603 (0603 (1608M) Inductor)
pins: 1, 2

## SDCL1608CR12JTDF
designator L?  Inductance: 120nH
Inductor, 120nH, ±5%, 1.4Ω, 200mA, SMD 0603; Manufacturer: Sunlord; Manufacturer Part Number: SDCL1608CR12JTDF; Self-Resonant Frequency: 50MHz; Q Factor: 8@50MHz; Package Size: 0603; JLCPCB Basic Part: No; JLCPCB Part Number: C16151; Supplier 1: LCSC; Category: Inductors; Supplier Part Number 1: C16151; Tolerance: ±5%; Rated Current: 200mA; DC Resistance: 1.4Ω; RoHS: Yes; ComponentLink1Description: Datasheet; ComponentLink1URL: https://wmsc.lcsc.com/wmsc/upload/file/pdf/v2/lcsc/2310301641_Sunlord-SDCL1608CR12JTDF_C16151.pdf; ComponentLink2Description: JLCPCB Part URL; ComponentLink2URL: https://jlcpcb.com/partdetail/C16151; ComponentLink3Description: LCSC Part URL; ComponentLink3URL: https://lcsc.com/product-detail/Inductors-SMD_Sunlord-Sunlord-SDCL1608CR12JTDF_C16151.html
footprint IND-0603 (0603 (1608M) Inductor)
pins: 1, 2

## SDCL1608CR15JTDF
designator L?  Inductance: 150nH
Inductor, 150nH, ±5%, 1.6Ω, 200mA, SMD 0603; Manufacturer: Sunlord; Manufacturer Part Number: SDCL1608CR15JTDF; Self-Resonant Frequency: 100MHz; Q Factor: 8@100MHz; Package Size: 0603; JLCPCB Basic Part: No; JLCPCB Part Number: C15566; Supplier 1: LCSC; Category: Inductors; Supplier Part Number 1: C15566; Tolerance: ±5%; Rated Current: 200mA; DC Resistance: 1.6Ω; RoHS: Yes; ComponentLink1Description: Datasheet; ComponentLink1URL: https://wmsc.lcsc.com/wmsc/upload/file/pdf/v2/lcsc/2310301641_Sunlord-SDCL1608CR15JTDF_C15566.pdf; ComponentLink2Description: JLCPCB Part URL; ComponentLink2URL: https://jlcpcb.com/partdetail/C15566; ComponentLink3Description: LCSC Part URL; ComponentLink3URL: https://lcsc.com/product-detail/Inductors-SMD_Sunlord-Sunlord-SDCL1608CR15JTDF_C15566.html
footprint IND-0603 (0603 (1608M) Inductor)
pins: 1, 2

## SDCL1608CR18JTDF
designator L?  Inductance: 180nH
Inductor, 180nH, ±5%, 1.9Ω, 200mA, SMD 0603; Manufacturer: Sunlord; Manufacturer Part Number: SDCL1608CR18JTDF; Self-Resonant Frequency: 50MHz; Q Factor: 8@50MHz; Package Size: 0603; JLCPCB Basic Part: No; JLCPCB Part Number: C21430; Supplier 1: LCSC; Category: Inductors; Supplier Part Number 1: C21430; Tolerance: ±5%; Rated Current: 200mA; DC Resistance: 1.9Ω; RoHS: Yes; ComponentLink1Description: Datasheet; ComponentLink1URL: https://wmsc.lcsc.com/wmsc/upload/file/pdf/v2/lcsc/2310301641_Sunlord-SDCL1608CR18JTDF_C21430.pdf; ComponentLink2Description: JLCPCB Part URL; ComponentLink2URL: https://jlcpcb.com/partdetail/C21430; ComponentLink3Description: LCSC Part URL; ComponentLink3URL: https://lcsc.com/product-detail/Inductors-SMD_Sunlord-Sunlord-SDCL1608CR18JTDF_C21430.html
footprint IND-0603 (0603 (1608M) Inductor)
pins: 1, 2

## SDCL1608CR18KTDF
designator L?  Inductance: 180nH
Inductor, 180nH, ±10%, 1.9Ω, 200mA, SMD 0603; Manufacturer: Sunlord; Manufacturer Part Number: SDCL1608CR18KTDF; Package Size: 0603; JLCPCB Basic Part: No; JLCPCB Part Number: C279934; Supplier 1: LCSC; Category: Inductors; Supplier Part Number 1: C279934; Tolerance: ±10%; Rated Current: 200mA; DC Resistance: 1.9Ω; RoHS: Yes; ComponentLink1Description: Datasheet; ComponentLink1URL: https://wmsc.lcsc.com/wmsc/upload/file/pdf/v2/lcsc/2310301641_Sunlord-SDCL1608CR18KTDF_C279934.pdf; ComponentLink2Description: JLCPCB Part URL; ComponentLink2URL: https://jlcpcb.com/partdetail/C279934; ComponentLink3Description: LCSC Part URL; ComponentLink3URL: https://lcsc.com/product-detail/Inductors-SMD_Sunlord-Sunlord-SDCL1608CR18KTDF_C279934.html
footprint IND-0603 (0603 (1608M) Inductor)
pins: 1, 2
